# Altium footprint library PcbLib1.PcbLib: 49 footprints (part 4 of 4)
Each footprint in its own frame and in the unit in brackets; x right, y up, seen from the top. Pads: shape width x height; smd on the part's side, far side on the other; paste and mask are expansions set on the pad; w line width, h text height; cw(c..) or ccw(c..) is an arc to the next point about the centre after c.
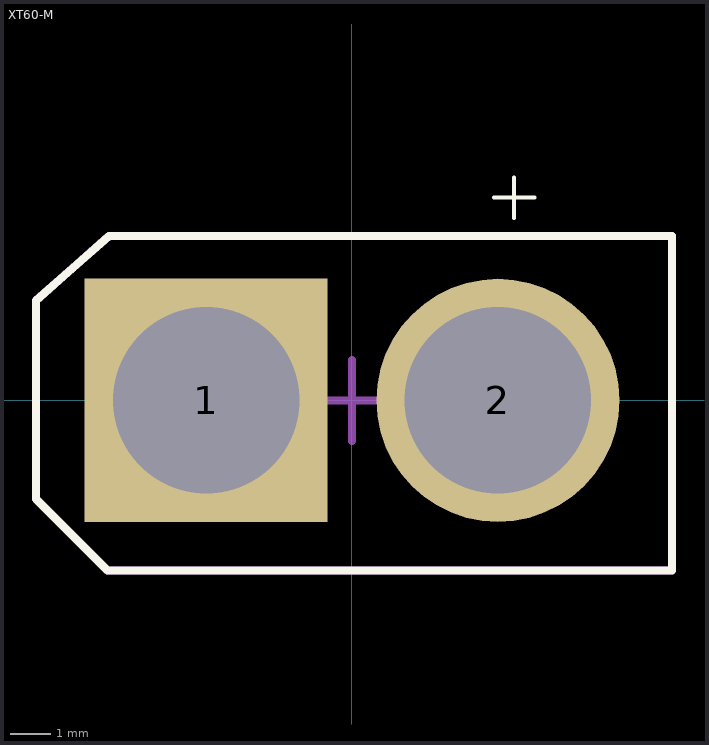
[diagram p3: the footprint, top view; thin cyan lines are the x and y axes]

## XT60-M [mm]
pads (2):
  rect 6x6 hole 4.6: 1(-3.6,0)
  round 6 hole 4.6: 2(3.6,0)
Top Overlay:
  lines w0.1: 4,4.5 4,5.5 ; 3.5,5 4.5,5 3.5,5
  lines w0.2: -7.8,-2.429 -6.029,-4.2 7.9,-4.2 7.9,4.05 -5.999,4.05 -6.884,3.267 -7.8,2.459 -7.8,-2.429
Bottom 3D Body:
  lines w0.2: -1,0 1,0 ; 0,-1 0,1 ; -7.8,-2.429 -6.029,-4.2 7.9,-4.2 7.9,4.05 -5.999,4.05 -6.884,3.267 -7.8,2.459 -7.8,-2.429
Bottom Component Center:
  lines w0.2: -7.8,-2.429 -7.8,2.459 -6.884,3.267 -5.999,4.05 7.9,4.05 7.9,-4.2 -6.029,-4.2 -7.8,-2.429
  text "'.Designator'" at -7.4,-1.7 h2
3D body "XT60-M--3DModel-STEP-56544 (1).STEP": height 16.01, standoff -4.49, extent -7.75,-4.1 7.75,4